# Altium footprint library PCB SMD.PcbLib: 79 footprints (part 4 of 5)
Each footprint in its own frame and in the unit in brackets; x right, y up, seen from the top. Pads: shape width x height; smd on the part's side, far side on the other; paste and mask are expansions set on the pad; w line width, h text height; cw(c..) or ccw(c..) is an arc to the next point about the centre after c.
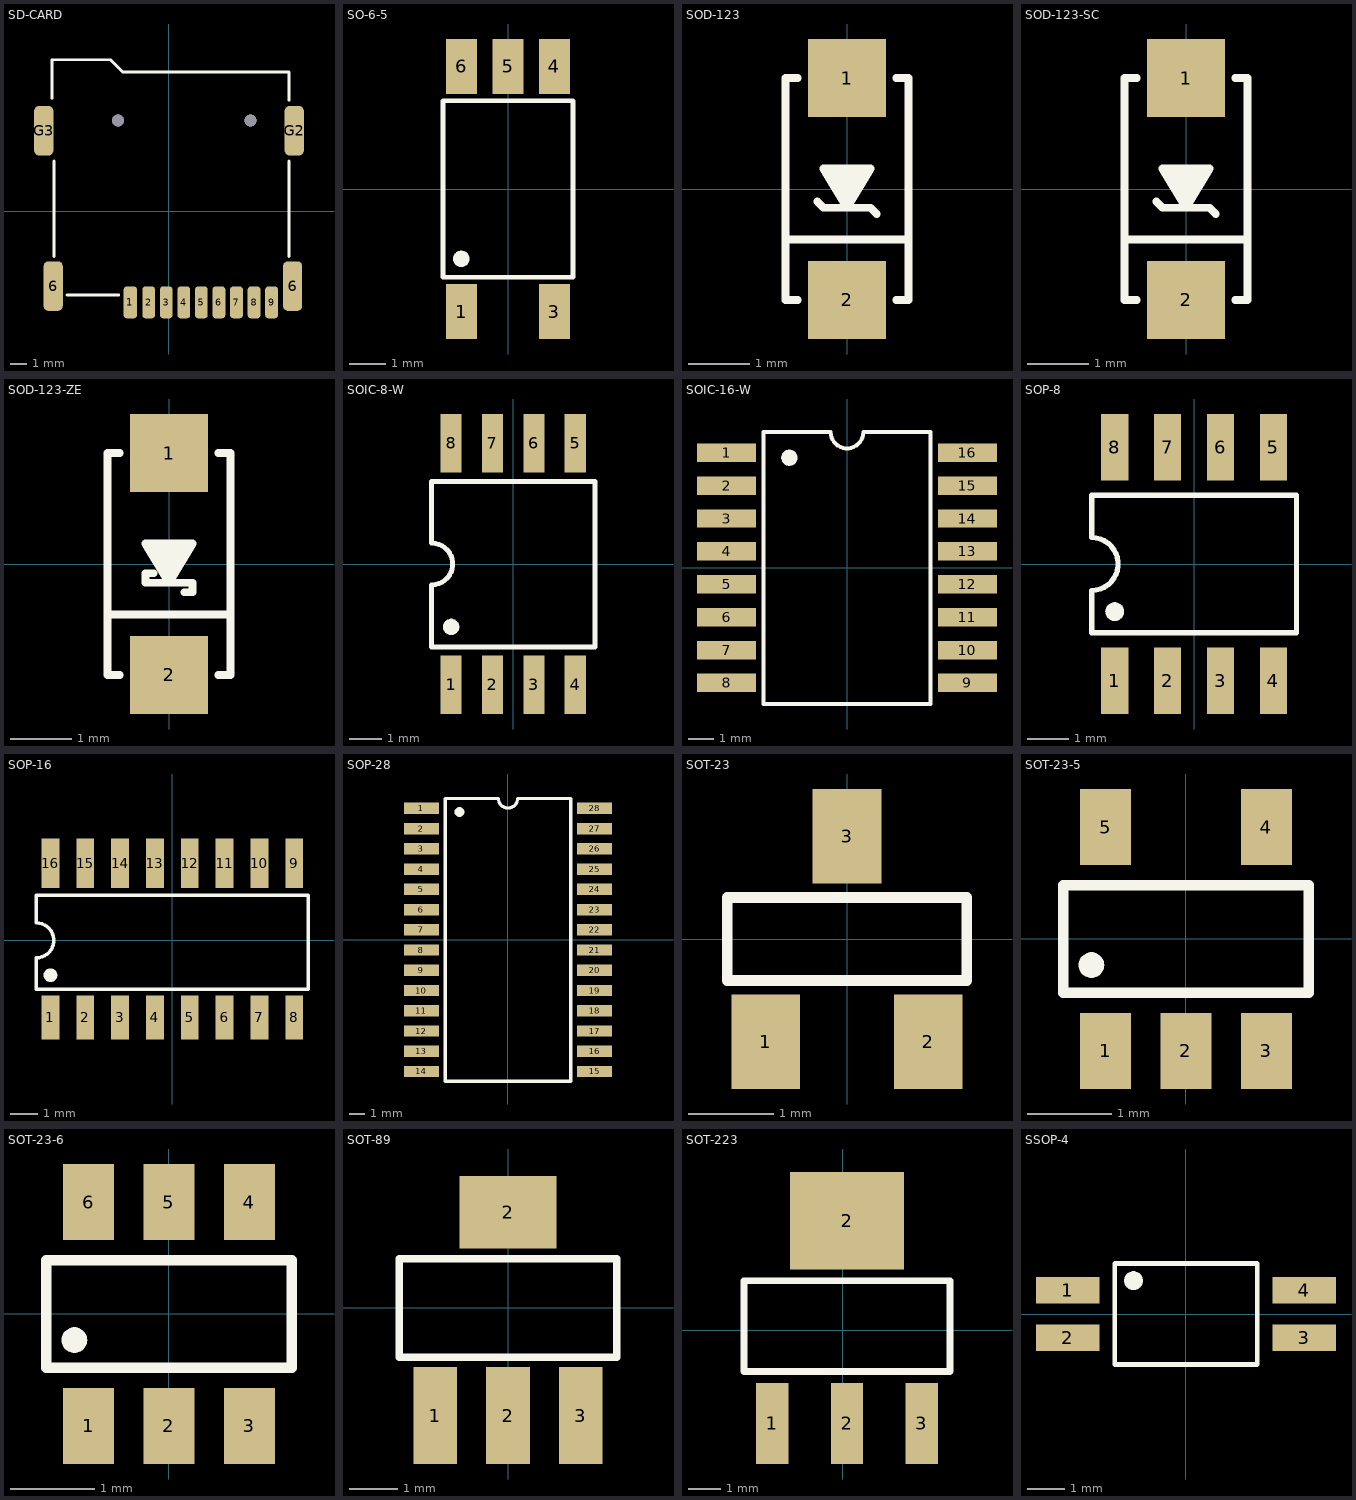
[diagram p3: the footprints below, top view; thin cyan lines are the x and y axes]

## SD-CARD [mm]
pads (13):
  rrect50% 0.85x2 smd: 1(-2.423,-5.694)
  rrect50% 0.8x2 smd: 2(-1.273,-5.694) 3(-0.173,-5.694) 4(0.927,-5.694) 5(2.027,-5.694) 6(3.127,-5.694) 7(4.227,-5.694) 8(5.327,-5.694) 9(6.427,-5.694)
  rrect50% 1.2x3.1 smd: 6(-7.254,-4.679) 6(7.746,-4.679) G2(7.846,5.059) G3(-7.846,5.059)
via 5.108,5.694 diameter 0.762 hole 0.762
via -3.204,5.694 diameter 0.762 hole 0.762
Top Overlay:
  lines w0.178: -7.338,7.091 -7.338,9.504 -3.782,9.504 -3.655,9.504 -2.893,8.742 7.521,8.742 7.521,6.964 ; -7.211,-2.815 -7.211,3.154 ; -6.38,-5.228 -3.147,-5.228 ; 7.521,-2.815 7.521,3.154
3D body "User Library-MEM2055-00-190-01-A_revG.step": height 1.94, standoff -0.51, extent -8.161,-5.648 7.839,9.602

## SO-6-5 [mm]
pads (6):
  rect 0.85x1.5 smd: 1(-1.27,-3.35) 3(1.27,-3.35) 4(1.27,3.35) 5(0,3.35) 6(-1.27,3.35)
  round 0.457 on Top Overlay: ""(-1.276,-1.91)
Top Overlay:
  lines w0.127: -1.778,-2.413 -1.778,2.413 1.778,2.413 1.778,-2.413 -1.778,-2.413
3D body "User Library-SO6-5.STEP": height 1.7, standoff 0, extent -1.85,-3.325 1.85,3.325

## SOD-123 [mm]
pads (2):
  rect 1.27x1.27 smd: 1(0,1.8) 2(0,-1.8)
Top Overlay:
  region: 0,-0.305 -0.381,0.33 0.381,0.33
  lines w0.127: -1,-0.818 1,-0.818 ; -0.8,-1.8 -1,-1.8 -1,1.8 -0.8,1.8 ; -0.483,-0.203 -0.381,-0.305 0.381,-0.305 0.483,-0.407 ; 0.8,-1.8 1,-1.8 1,1.8 0.8,1.8 ; -0.381,0.33 0.381,0.33 0,-0.305 -0.381,0.33
3D body "User Library-SOD123.step": height 1.27, standoff 0, extent -0.8,-1.85 0.8,1.85

## SOD-123-SC [mm]
pads (2):
  rect 1.27x1.27 smd: 1(0,1.8) 2(0,-1.8)
Top Overlay:
  region: 0,-0.305 -0.381,0.33 0.381,0.33
  lines w0.127: -1,-0.818 1,-0.818 ; -0.8,-1.8 -1,-1.8 -1,1.8 -0.8,1.8 ; -0.483,-0.203 -0.381,-0.305 0.381,-0.305 0.483,-0.407 ; 0.8,-1.8 1,-1.8 1,1.8 0.8,1.8 ; -0.381,0.33 0,-0.305 0.381,0.33 -0.381,0.33
3D body "User Library-SOD123.step": height 1.27, standoff 0, extent -0.8,-1.85 0.8,1.85

## SOD-123-ZE [mm]
pads (2):
  rect 1.27x1.27 smd: 1(0,1.8) 2(0,-1.8)
Top Overlay:
  region: 0,-0.305 -0.381,0.33 0.381,0.33
  lines w0.127: -1,-0.818 1,-0.818 ; -0.8,-1.8 -1,-1.8 -1,1.8 -0.8,1.8 ; -0.253,-0.151 -0.381,-0.151 -0.381,-0.305 0.381,-0.305 0.381,-0.458 0.253,-0.458 ; 0.8,-1.8 1,-1.8 1,1.8 0.8,1.8 ; -0.381,0.33 0,-0.305 0.381,0.33 -0.381,0.33
3D body "User Library-SOD123.step": height 1.27, standoff 0, extent -0.8,-1.85 0.8,1.85

## SOIC-8-W [mm]
pads (9):
  rect 0.65x1.8 smd: 1(-1.905,-3.7) 2(-0.635,-3.7) 3(0.635,-3.7) 4(1.905,-3.7) 5(1.905,3.7) 6(0.635,3.7) 7(-0.635,3.7) 8(-1.905,3.7)
  round 0.508 on Top Overlay: ""(-1.905,-1.93)
Top Overlay:
  lines w0.15: -2.509,-0.635 -2.509,-2.54 2.509,-2.54 2.509,2.526 -2.509,2.526 -2.509,0.635 ; -2.489,-0.635 ccw(c-2.489,0) -2.489,0.635
3D body "User Library-SOIC8_Wide_5mmx5mm.STEP": height 1.75, standoff -0.01, extent -2.717,-4.051 2.743,4.051

## SOIC-16-W [mil]
pads (17):
  rect 90x28 smd: 1(-183.07,175) 2(-183.07,125) 3(-183.07,75) 4(-183.07,25) 5(-183.07,-25) 6(-183.07,-75) 7(-183.07,-125) 8(-183.07,-175) 9(183.07,-175) 10(183.07,-125) 11(183.07,-75) 12(183.07,-25) 13(183.07,25) 14(183.07,75) 15(183.07,125) 16(183.07,175)
  round 25 on Top Overlay: ""(-87.6,167.32)
Top Overlay:
  lines w6: -126.97,-206.69 -126.97,206.69 -25,206.69 ccw(c0,206.69) 25,206.69 126.97,206.69 126.97,-206.69 -126.97,-206.69
3D body "User Library-SOIC16_Wide_JEDEC_MS-013AA.STEP": height 100.9, standoff -3.43, extent -209.25,-206.69 209.25,206.69

## SOP-8 [mm]
pads (9):
  rect 0.65x1.6 smd: 1(-1.905,-2.8) 2(-0.635,-2.8) 3(0.635,-2.8) 4(1.905,-2.8) 5(1.905,2.8) 6(0.635,2.8) 7(-0.635,2.8) 8(-1.905,2.8)
  round 0.457 on Top Overlay: ""(-1.905,-1.143)
Top Overlay:
  lines w0.127: -2.458,-1.651 -2.458,-0.635 ccw(c-2.458,0) -2.458,0.635 -2.458,1.651 2.458,1.651 2.458,-1.651 -2.458,-1.651
3D body "User Library-sop-8.STEP": height 1.6, standoff 0, extent -2.51,-3.021 2.51,3.021

## SOP-16 [mm]
pads (17):
  rect 0.65x1.6 smd: 1(-4.445,-2.805) 2(-3.175,-2.805) 3(-1.905,-2.805) 4(-0.635,-2.805) 5(0.635,-2.805) 6(1.905,-2.805) 7(3.175,-2.805) 8(4.445,-2.805)
  rect 0.65x1.8 smd: 9(4.445,2.805) 10(3.175,2.805) 11(1.905,2.805) 12(0.635,2.805) 13(-0.635,2.805) 14(-1.905,2.805) 15(-3.175,2.805) 16(-4.445,2.805)
  round 0.508 on Top Overlay: ""(-4.445,-1.27)
Top Overlay:
  lines w0.127: -4.953,-1.778 -4.953,-0.635 ccw(c-4.953,0) -4.953,0.635 -4.953,1.651 4.953,1.651 4.953,-1.778 -4.953,-1.778
3D body "SW3dPS-SOIC127P600X175-16.STEP": height 1.65, standoff 0, extent -5,-3.04 5,3.04

## SOP-28 [mil]
pads (29):
  rect 86.61x28 smd: 1(-214,325) 2(-214,275) 3(-214,225) 4(-214,175) 5(-214,125) 6(-214,75) 7(-214,25) 8(-214,-25) 9(-214,-75) 10(-214,-125) 11(-214,-175) 12(-214,-225) 13(-214,-275) 14(-214,-325) 15(214.01,-325) 16(214.01,-275) 17(214.01,-225) 18(214.01,-175) 19(214.01,-125) 20(214.01,-75) 21(214.01,-25) 22(214.01,25) 23(214.01,75) 24(214.01,125) 25(214.01,175) 26(214.01,225) 27(214.01,275) 28(214.01,325)
  round 25 on Top Overlay: ""(-120,316)
Top Overlay:
  lines w8: -155,-349.33 -155,349.33 -23.62,349.33 ccw(c0,349.33) 23.62,349.33 155,349.33 155,-349.33 -155,-349.33
3D body "User Library-28-SOIC.STEP": height 107.28, standoff -0.98, extent -204.51,-352.36 201,352.36

## SOT-23 [mm]
pads (3):
  rect 0.8x1.1 smd: 1(-0.95,-1.2) 2(0.95,-1.2) 3(0,1.2)
Top Overlay:
  lines w0.127: -1.397,-0.483 -1.397,0.483 1.397,0.483 1.397,-0.483 -1.397,-0.483
3D body "SW3DPS-SOT-23-DEFAULT.STEP": height 1.11, standoff 0.01, extent -1.5,-1.25 1.5,1.25

## SOT-23-5 [mm]
pads (6):
  rect 0.6x0.9 smd: 1(-0.95,-1.321) 2(0,-1.321) 3(0.95,-1.321) 4(0.95,1.321) 5(-0.95,1.321)
  round 0.305 on Top Overlay: ""(-1.117,-0.308)
Top Overlay:
  lines w0.127: -1.45,-0.635 -1.45,0.635 1.45,0.635 1.45,-0.635 -1.45,-0.635
3D body "User Library-SOT23-5-2.STEP": height 1.45, standoff 0, extent -1.45,-1.4 1.45,1.4

## SOT-23-6 [mm]
pads (7):
  rect 0.6x0.9 smd: 1(-0.95,-1.321) 2(0,-1.321) 3(0.95,-1.321) 4(0.95,1.321) 5(0,1.321) 6(-0.95,1.321)
  round 0.305 on Top Overlay: ""(-1.117,-0.308)
Top Overlay:
  lines w0.127: -1.45,-0.635 -1.45,0.635 1.45,0.635 1.45,-0.635 -1.45,-0.635
3D body "User Library-SOT23-6-2.STEP": height 1.45, standoff 0, extent -1.45,-1.4 1.45,1.4

## SOT-89 [mm]
pads (4):
  rect 0.9x2 smd: 1(-1.5,-2.225) 2(0,-2.225) 3(1.5,-2.225)
  rect 2x1.5 smd: 2(0,1.975)
Top Overlay:
  lines w0.152: -2.25,-1.016 2.25,-1.016 2.25,1.016 -2.25,1.016 -2.25,-1.016
3D body "User Library-SOT89-3-1.STEP": height 1.71, standoff 0.01, extent -2.349,-2.758 2.349,1.692

## SOT-223 [mm]
pads (4):
  rect 1x2.5 smd: 1(-2.173,-2.873) 2(0.127,-2.873) 3(2.427,-2.873)
  rect 3.5x3 smd: 2(0.127,3.377)
Top Overlay:
  lines w0.203: -3.048,-1.27 -3.048,1.524 3.302,1.524 3.302,-1.27 -3.048,-1.27
3D body "SW3DPS-SOT-223-DEFAULT.STEP": height 1.61, standoff -0.07, extent -3.123,-3.353 3.377,3.607

## SSOP-4 [mm]
pads (5):
  rect 1.7x0.7 smd: 1(-3.15,0.635) 2(-3.15,-0.635) 3(3.15,-0.635) 4(3.15,0.635)
  round 0.508 on Top Overlay: ""(-1.4,0.89)
Top Overlay:
  lines w0.127: -1.9,-1.348 -1.9,1.348 1.9,1.348 1.9,-1.348 -1.9,-1.348
3D body "User Library-SSOP-4.step": height 2, standoff -0.02, extent -3.444,-1.35 3.556,1.35